# Altium footprint library ST封装.PcbLib: 1336 footprints (part 92 of 109)
Each footprint in its own frame and in the unit in brackets; x right, y up, seen from the top. Pads: shape width x height; smd on the part's side, far side on the other; paste and mask are expansions set on the pad; w line width, h text height; cw(c..) or ccw(c..) is an arc to the next point about the centre after c.
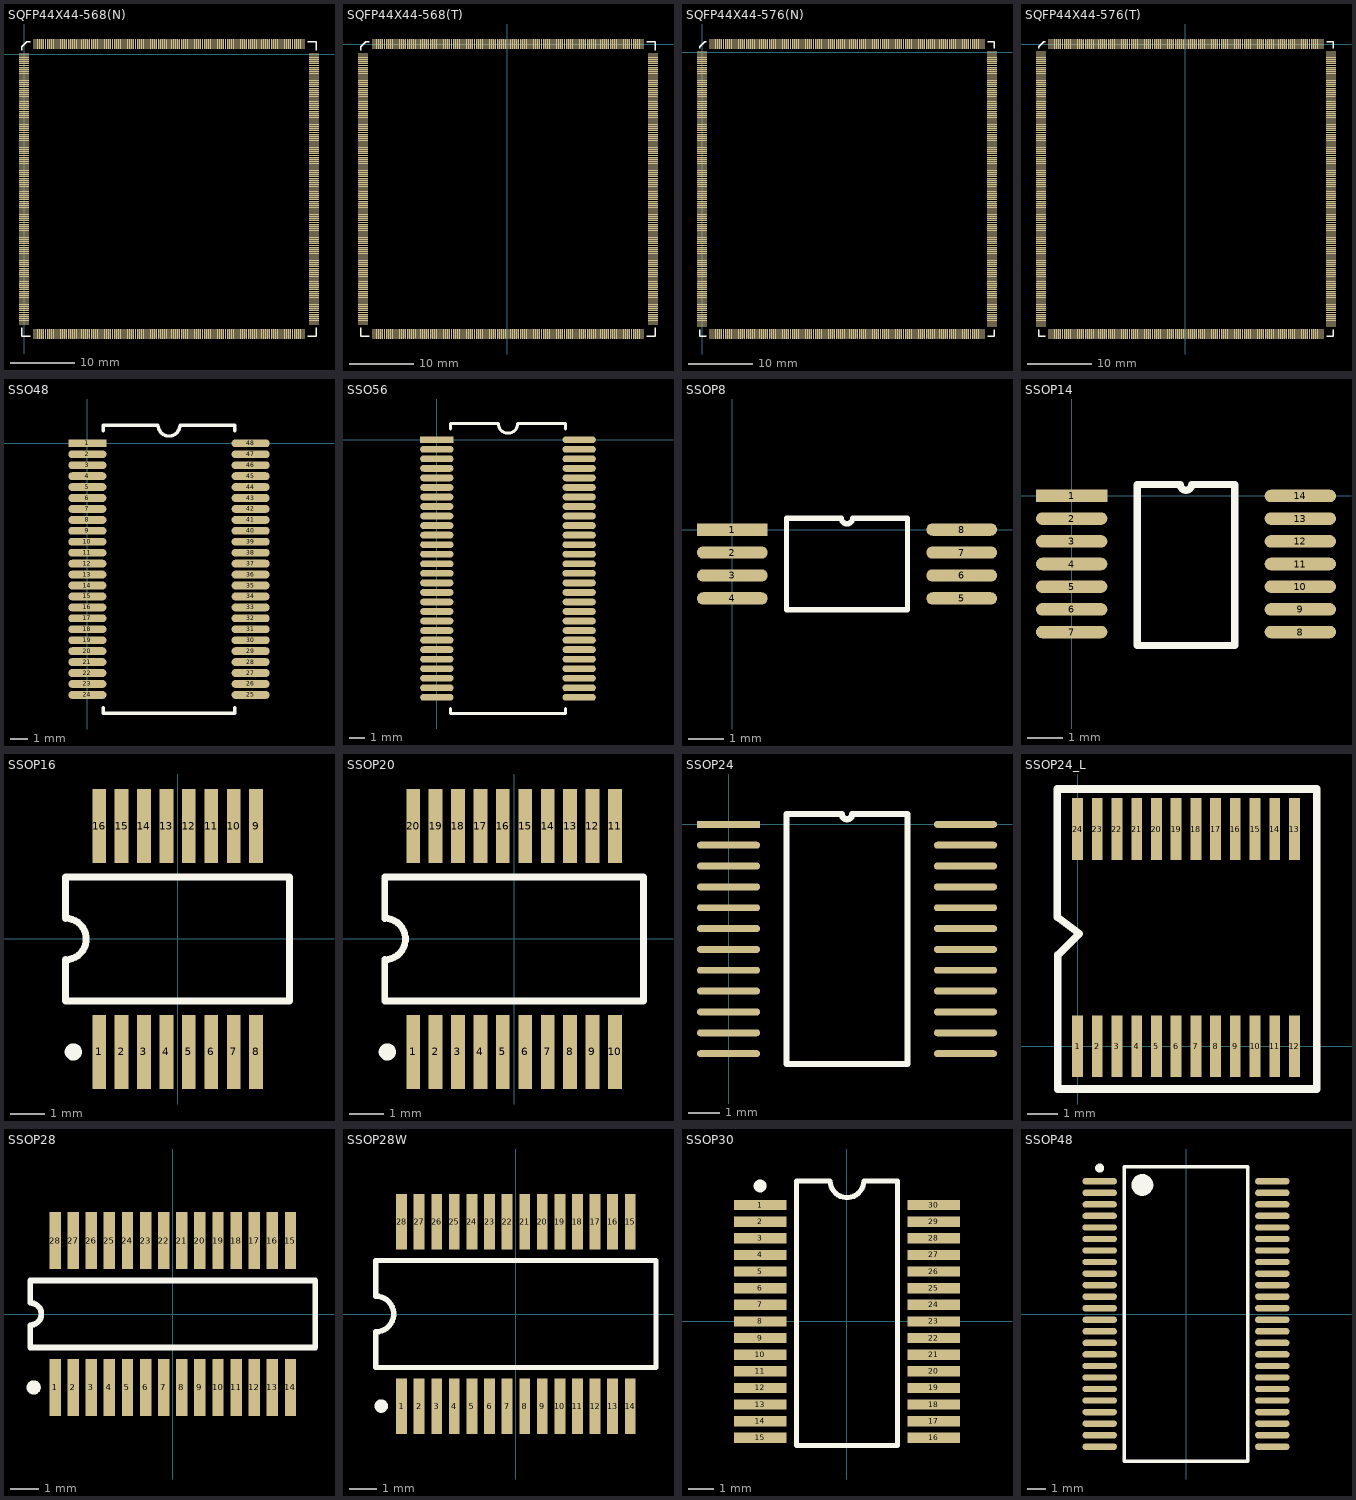
[diagram p91: the footprints below, top view; thin cyan lines are the x and y axes]

## SQFP44X44-568(N) [mm]
pads (568):
  rect 1.6x0.2 smd: 1(0,0)
  oval 1.6x0.2 smd: 2(0,-0.3) 3(0,-0.6) 4(0,-0.9) 5(0,-1.2) 6(0,-1.5) 7(0,-1.8) 8(0,-2.1) 9(0,-2.4) 10(0,-2.7) 11(0,-3) 12(0,-3.3) 13(0,-3.6) 14(0,-3.9) 15(0,-4.2) 16(0,-4.5) 17(0,-4.8) 18(0,-5.1) 19(0,-5.4) 20(0,-5.7) 21(0,-6) 22(0,-6.3) 23(0,-6.6) 24(0,-6.9) 25(0,-7.2) 26(0,-7.5) 27(0,-7.8) 28(0,-8.1) 29(0,-8.4) 30(0,-8.7) 31(0,-9) 32(0,-9.3) 33(0,-9.6) 34(0,-9.9) 35(0,-10.2) 36(0,-10.5) 37(0,-10.8) 38(0,-11.1) 39(0,-11.4) 40(0,-11.7) 41(0,-12) 42(0,-12.3) 43(0,-12.6) 44(0,-12.9) 45(0,-13.2) 46(0,-13.5) 47(0,-13.8) 48(0,-14.1) 49(0,-14.4) 50(0,-14.7) 51(0,-15) 52(0,-15.3) 53(0,-15.6) 54(0,-15.9) 55(0,-16.2) 56(0,-16.5) 57(0,-16.8) 58(0,-17.1) 59(0,-17.4) 60(0,-17.7) 61(0,-18) 62(0,-18.3) 63(0,-18.6) 64(0,-18.9) 65(0,-19.2) 66(0,-19.5) 67(0,-19.8) 68(0,-20.1) 69(0,-20.4) 70(0,-20.7) 71(0,-21) 72(0,-21.3) 73(0,-21.6) 74(0,-21.9) 75(0,-22.2) 76(0,-22.5) 77(0,-22.8) 78(0,-23.1) 79(0,-23.4) 80(0,-23.7) 81(0,-24) 82(0,-24.3) 83(0,-24.6) 84(0,-24.9) 85(0,-25.2) 86(0,-25.5) 87(0,-25.8) 88(0,-26.1) 89(0,-26.4) 90(0,-26.7) 91(0,-27) 92(0,-27.3) 93(0,-27.6) 94(0,-27.9) 95(0,-28.2) 96(0,-28.5) 97(0,-28.8) 98(0,-29.1) 99(0,-29.4) 100(0,-29.7) 101(0,-30) 102(0,-30.3) 103(0,-30.6) 104(0,-30.9) 105(0,-31.2) 106(0,-31.5) 107(0,-31.8) 108(0,-32.1) 109(0,-32.4) 110(0,-32.7) 111(0,-33) 112(0,-33.3) 113(0,-33.6) 114(0,-33.9) 115(0,-34.2) 116(0,-34.5) 117(0,-34.8) 118(0,-35.1) 119(0,-35.4) 120(0,-35.7) 121(0,-36) 122(0,-36.3) 123(0,-36.6) 124(0,-36.9) 125(0,-37.2) 126(0,-37.5) 127(0,-37.8) 128(0,-38.1) 129(0,-38.4) 130(0,-38.7) 131(0,-39) 132(0,-39.3) 133(0,-39.6) 134(0,-39.9) 135(0,-40.2) 136(0,-40.5) 137(0,-40.8) 138(0,-41.1) 139(0,-41.4) 140(0,-41.7) 141(0,-42) 142(0,-42.3) 285(45.4,-42.3) 286(45.4,-42) 287(45.4,-41.7) 288(45.4,-41.4) 289(45.4,-41.1) 290(45.4,-40.8) 291(45.4,-40.5) 292(45.4,-40.2) 293(45.4,-39.9) 294(45.4,-39.6) 295(45.4,-39.3) 296(45.4,-39) 297(45.4,-38.7) 298(45.4,-38.4) 299(45.4,-38.1) 300(45.4,-37.8) 301(45.4,-37.5) 302(45.4,-37.2) 303(45.4,-36.9) 304(45.4,-36.6) 305(45.4,-36.3) 306(45.4,-36) 307(45.4,-35.7) 308(45.4,-35.4) 309(45.4,-35.1) 310(45.4,-34.8) 311(45.4,-34.5) 312(45.4,-34.2) 313(45.4,-33.9) 314(45.4,-33.6) 315(45.4,-33.3) 316(45.4,-33) 317(45.4,-32.7) 318(45.4,-32.4) 319(45.4,-32.1) 320(45.4,-31.8) 321(45.4,-31.5) 322(45.4,-31.2) 323(45.4,-30.9) 324(45.4,-30.6) 325(45.4,-30.3) 326(45.4,-30) 327(45.4,-29.7) 328(45.4,-29.4) 329(45.4,-29.1) 330(45.4,-28.8) 331(45.4,-28.5) 332(45.4,-28.2) 333(45.4,-27.9) 334(45.4,-27.6) 335(45.4,-27.3) 336(45.4,-27) 337(45.4,-26.7) 338(45.4,-26.4) 339(45.4,-26.1) 340(45.4,-25.8) 341(45.4,-25.5) 342(45.4,-25.2) 343(45.4,-24.9) 344(45.4,-24.6) 345(45.4,-24.3) 346(45.4,-24) 347(45.4,-23.7) 348(45.4,-23.4) 349(45.4,-23.1) 350(45.4,-22.8) 351(45.4,-22.5) 352(45.4,-22.2) 353(45.4,-21.9) 354(45.4,-21.6) 355(45.4,-21.3) 356(45.4,-21) 357(45.4,-20.7) 358(45.4,-20.4) 359(45.4,-20.1) 360(45.4,-19.8) 361(45.4,-19.5) 362(45.4,-19.2) 363(45.4,-18.9) 364(45.4,-18.6) 365(45.4,-18.3) 366(45.4,-18) 367(45.4,-17.7) 368(45.4,-17.4) 369(45.4,-17.1) 370(45.4,-16.8) 371(45.4,-16.5) 372(45.4,-16.2) 373(45.4,-15.9) 374(45.4,-15.6) 375(45.4,-15.3) 376(45.4,-15) 377(45.4,-14.7) 378(45.4,-14.4) 379(45.4,-14.1) 380(45.4,-13.8) 381(45.4,-13.5) 382(45.4,-13.2) 383(45.4,-12.9) 384(45.4,-12.6) 385(45.4,-12.3) 386(45.4,-12) 387(45.4,-11.7) 388(45.4,-11.4) 389(45.4,-11.1) 390(45.4,-10.8) 391(45.4,-10.5) 392(45.4,-10.2) 393(45.4,-9.9) 394(45.4,-9.6) 395(45.4,-9.3) 396(45.4,-9) 397(45.4,-8.7) 398(45.4,-8.4) 399(45.4,-8.1) 400(45.4,-7.8) 401(45.4,-7.5) 402(45.4,-7.2) 403(45.4,-6.9) 404(45.4,-6.6) 405(45.4,-6.3) 406(45.4,-6) 407(45.4,-5.7) 408(45.4,-5.4) 409(45.4,-5.1) 410(45.4,-4.8) 411(45.4,-4.5) 412(45.4,-4.2) 413(45.4,-3.9) 414(45.4,-3.6) 415(45.4,-3.3) 416(45.4,-3) 417(45.4,-2.7) 418(45.4,-2.4) 419(45.4,-2.1) 420(45.4,-1.8) 421(45.4,-1.5) 422(45.4,-1.2) 423(45.4,-0.9) 424(45.4,-0.6) 425(45.4,-0.3) 426(45.4,0)
  oval 0.2x1.6 smd: 143(1.55,-43.85) 144(1.85,-43.85) 145(2.15,-43.85) 146(2.45,-43.85) 147(2.75,-43.85) 148(3.05,-43.85) 149(3.35,-43.85) 150(3.65,-43.85) 151(3.95,-43.85) 152(4.25,-43.85) 153(4.55,-43.85) 154(4.85,-43.85) 155(5.15,-43.85) 156(5.45,-43.85) 157(5.75,-43.85) 158(6.05,-43.85) 159(6.35,-43.85) 160(6.65,-43.85) 161(6.95,-43.85) 162(7.25,-43.85) 163(7.55,-43.85) 164(7.85,-43.85) 165(8.15,-43.85) 166(8.45,-43.85) 167(8.75,-43.85) 168(9.05,-43.85) 169(9.35,-43.85) 170(9.65,-43.85) 171(9.95,-43.85) 172(10.25,-43.85) 173(10.55,-43.85) 174(10.85,-43.85) 175(11.15,-43.85) 176(11.45,-43.85) 177(11.75,-43.85) 178(12.05,-43.85) 179(12.35,-43.85) 180(12.65,-43.85) 181(12.95,-43.85) 182(13.25,-43.85) 183(13.55,-43.85) 184(13.85,-43.85) 185(14.15,-43.85) 186(14.45,-43.85) 187(14.75,-43.85) 188(15.05,-43.85) 189(15.35,-43.85) 190(15.65,-43.85) 191(15.95,-43.85) 192(16.25,-43.85) 193(16.55,-43.85) 194(16.85,-43.85) 195(17.15,-43.85) 196(17.45,-43.85) 197(17.75,-43.85) 198(18.05,-43.85) 199(18.35,-43.85) 200(18.65,-43.85) 201(18.95,-43.85) 202(19.25,-43.85) 203(19.55,-43.85) 204(19.85,-43.85) 205(20.15,-43.85) 206(20.45,-43.85) 207(20.75,-43.85) 208(21.05,-43.85) 209(21.35,-43.85) 210(21.65,-43.85) 211(21.95,-43.85) 212(22.25,-43.85) 213(22.55,-43.85) 214(22.85,-43.85) 215(23.15,-43.85) 216(23.45,-43.85) 217(23.75,-43.85) 218(24.05,-43.85) 219(24.35,-43.85) 220(24.65,-43.85) 221(24.95,-43.85) 222(25.25,-43.85) 223(25.55,-43.85) 224(25.85,-43.85) 225(26.15,-43.85) 226(26.45,-43.85) 227(26.75,-43.85) 228(27.05,-43.85) 229(27.35,-43.85) 230(27.65,-43.85) 231(27.95,-43.85) 232(28.25,-43.85) 233(28.55,-43.85) 234(28.85,-43.85) 235(29.15,-43.85) 236(29.45,-43.85) 237(29.75,-43.85) 238(30.05,-43.85) 239(30.35,-43.85) 240(30.65,-43.85) 241(30.95,-43.85) 242(31.25,-43.85) 243(31.55,-43.85) 244(31.85,-43.85) 245(32.15,-43.85) 246(32.45,-43.85) 247(32.75,-43.85) 248(33.05,-43.85) 249(33.35,-43.85) 250(33.65,-43.85) 251(33.95,-43.85) 252(34.25,-43.85) 253(34.55,-43.85) 254(34.85,-43.85) 255(35.15,-43.85) 256(35.45,-43.85) 257(35.75,-43.85) 258(36.05,-43.85) 259(36.35,-43.85) 260(36.65,-43.85) 261(36.95,-43.85) 262(37.25,-43.85) 263(37.55,-43.85) 264(37.85,-43.85) 265(38.15,-43.85) 266(38.45,-43.85) 267(38.75,-43.85) 268(39.05,-43.85) 269(39.35,-43.85) 270(39.65,-43.85) 271(39.95,-43.85) 272(40.25,-43.85) 273(40.55,-43.85) 274(40.85,-43.85) 275(41.15,-43.85) 276(41.45,-43.85) 277(41.75,-43.85) 278(42.05,-43.85) 279(42.35,-43.85) 280(42.65,-43.85) 281(42.95,-43.85) 282(43.25,-43.85) 283(43.55,-43.85) 284(43.85,-43.85) 427(43.85,1.55) 428(43.55,1.55) 429(43.25,1.55) 430(42.95,1.55) 431(42.65,1.55) 432(42.35,1.55) 433(42.05,1.55) 434(41.75,1.55) 435(41.45,1.55) 436(41.15,1.55) 437(40.85,1.55) 438(40.55,1.55) 439(40.25,1.55) 440(39.95,1.55) 441(39.65,1.55) 442(39.35,1.55) 443(39.05,1.55) 444(38.75,1.55) 445(38.45,1.55) 446(38.15,1.55) 447(37.85,1.55) 448(37.55,1.55) 449(37.25,1.55) 450(36.95,1.55) 451(36.65,1.55) 452(36.35,1.55) 453(36.05,1.55) 454(35.75,1.55) 455(35.45,1.55) 456(35.15,1.55) 457(34.85,1.55) 458(34.55,1.55) 459(34.25,1.55) 460(33.95,1.55) 461(33.65,1.55) 462(33.35,1.55) 463(33.05,1.55) 464(32.75,1.55) 465(32.45,1.55) 466(32.15,1.55) 467(31.85,1.55) 468(31.55,1.55) 469(31.25,1.55) 470(30.95,1.55) 471(30.65,1.55) 472(30.35,1.55) 473(30.05,1.55) 474(29.75,1.55) 475(29.45,1.55) 476(29.15,1.55) 477(28.85,1.55) 478(28.55,1.55) 479(28.25,1.55) 480(27.95,1.55) 481(27.65,1.55) 482(27.35,1.55) 483(27.05,1.55) 484(26.75,1.55) 485(26.45,1.55) 486(26.15,1.55) 487(25.85,1.55) 488(25.55,1.55) 489(25.25,1.55) 490(24.95,1.55) 491(24.65,1.55) 492(24.35,1.55) 493(24.05,1.55) 494(23.75,1.55) 495(23.45,1.55) 496(23.15,1.55) 497(22.85,1.55) 498(22.55,1.55) 499(22.25,1.55) 500(21.95,1.55) 501(21.65,1.55) 502(21.35,1.55) 503(21.05,1.55) 504(20.75,1.55) 505(20.45,1.55) 506(20.15,1.55) 507(19.85,1.55) 508(19.55,1.55) 509(19.25,1.55) 510(18.95,1.55) 511(18.65,1.55) 512(18.35,1.55) 513(18.05,1.55) 514(17.75,1.55) 515(17.45,1.55) 516(17.15,1.55) 517(16.85,1.55) 518(16.55,1.55) 519(16.25,1.55) 520(15.95,1.55) 521(15.65,1.55) 522(15.35,1.55) 523(15.05,1.55) 524(14.75,1.55) 525(14.45,1.55) 526(14.15,1.55) 527(13.85,1.55) 528(13.55,1.55) 529(13.25,1.55) 530(12.95,1.55) 531(12.65,1.55) 532(12.35,1.55) 533(12.05,1.55) 534(11.75,1.55) 535(11.45,1.55) 536(11.15,1.55) 537(10.85,1.55) 538(10.55,1.55) 539(10.25,1.55) 540(9.95,1.55) 541(9.65,1.55) 542(9.35,1.55) 543(9.05,1.55) 544(8.75,1.55) 545(8.45,1.55) 546(8.15,1.55) 547(7.85,1.55) 548(7.55,1.55) 549(7.25,1.55) 550(6.95,1.55) 551(6.65,1.55) 552(6.35,1.55) 553(6.05,1.55) 554(5.75,1.55) 555(5.45,1.55) 556(5.15,1.55) 557(4.85,1.55) 558(4.55,1.55) 559(4.25,1.55) 560(3.95,1.55) 561(3.65,1.55) 562(3.35,1.55) 563(3.05,1.55) 564(2.75,1.55) 565(2.45,1.55) 566(2.15,1.55) 567(1.85,1.55) 568(1.55,1.55)
Top Overlay:
  lines w0.2: -0.4,-42.9 -0.4,-44.25 0.95,-44.25 ; -0.4,0.6 -0.4,1.15 0.4,1.95 0.95,1.95 ; 44.45,-44.25 45.8,-44.25 45.8,-42.9 ; 44.45,1.95 45.8,1.95 45.8,0.6

## SQFP44X44-568(T) [mm]
pads (568):
  rect 0.2x1.6 smd: 1(0,0)
  oval 0.2x1.6 smd: 2(-0.3,0) 3(-0.6,0) 4(-0.9,0) 5(-1.2,0) 6(-1.5,0) 7(-1.8,0) 8(-2.1,0) 9(-2.4,0) 10(-2.7,0) 11(-3,0) 12(-3.3,0) 13(-3.6,0) 14(-3.9,0) 15(-4.2,0) 16(-4.5,0) 17(-4.8,0) 18(-5.1,0) 19(-5.4,0) 20(-5.7,0) 21(-6,0) 22(-6.3,0) 23(-6.6,0) 24(-6.9,0) 25(-7.2,0) 26(-7.5,0) 27(-7.8,0) 28(-8.1,0) 29(-8.4,0) 30(-8.7,0) 31(-9,0) 32(-9.3,0) 33(-9.6,0) 34(-9.9,0) 35(-10.2,0) 36(-10.5,0) 37(-10.8,0) 38(-11.1,0) 39(-11.4,0) 40(-11.7,0) 41(-12,0) 42(-12.3,0) 43(-12.6,0) 44(-12.9,0) 45(-13.2,0) 46(-13.5,0) 47(-13.8,0) 48(-14.1,0) 49(-14.4,0) 50(-14.7,0) 51(-15,0) 52(-15.3,0) 53(-15.6,0) 54(-15.9,0) 55(-16.2,0) 56(-16.5,0) 57(-16.8,0) 58(-17.1,0) 59(-17.4,0) 60(-17.7,0) 61(-18,0) 62(-18.3,0) 63(-18.6,0) 64(-18.9,0) 65(-19.2,0) 66(-19.5,0) 67(-19.8,0) 68(-20.1,0) 69(-20.4,0) 70(-20.7,0) 71(-21,0) 214(-21,-45.4) 215(-20.7,-45.4) 216(-20.4,-45.4) 217(-20.1,-45.4) 218(-19.8,-45.4) 219(-19.5,-45.4) 220(-19.2,-45.4) 221(-18.9,-45.4) 222(-18.6,-45.4) 223(-18.3,-45.4) 224(-18,-45.4) 225(-17.7,-45.4) 226(-17.4,-45.4) 227(-17.1,-45.4) 228(-16.8,-45.4) 229(-16.5,-45.4) 230(-16.2,-45.4) 231(-15.9,-45.4) 232(-15.6,-45.4) 233(-15.3,-45.4) 234(-15,-45.4) 235(-14.7,-45.4) 236(-14.4,-45.4) 237(-14.1,-45.4) 238(-13.8,-45.4) 239(-13.5,-45.4) 240(-13.2,-45.4) 241(-12.9,-45.4) 242(-12.6,-45.4) 243(-12.3,-45.4) 244(-12,-45.4) 245(-11.7,-45.4) 246(-11.4,-45.4) 247(-11.1,-45.4) 248(-10.8,-45.4) 249(-10.5,-45.4) 250(-10.2,-45.4) 251(-9.9,-45.4) 252(-9.6,-45.4) 253(-9.3,-45.4) 254(-9,-45.4) 255(-8.7,-45.4) 256(-8.4,-45.4) 257(-8.1,-45.4) 258(-7.8,-45.4) 259(-7.5,-45.4) 260(-7.2,-45.4) 261(-6.9,-45.4) 262(-6.6,-45.4) 263(-6.3,-45.4) 264(-6,-45.4) 265(-5.7,-45.4) 266(-5.4,-45.4) 267(-5.1,-45.4) 268(-4.8,-45.4) 269(-4.5,-45.4) 270(-4.2,-45.4) 271(-3.9,-45.4) 272(-3.6,-45.4) 273(-3.3,-45.4) 274(-3,-45.4) 275(-2.7,-45.4) 276(-2.4,-45.4) 277(-2.1,-45.4) 278(-1.8,-45.4) 279(-1.5,-45.4) 280(-1.2,-45.4) 281(-0.9,-45.4) 282(-0.6,-45.4) 283(-0.3,-45.4) 284(0,-45.4) 285(0.3,-45.4) 286(0.6,-45.4) 287(0.9,-45.4) 288(1.2,-45.4) 289(1.5,-45.4) 290(1.8,-45.4) 291(2.1,-45.4) 292(2.4,-45.4) 293(2.7,-45.4) 294(3,-45.4) 295(3.3,-45.4) 296(3.6,-45.4) 297(3.9,-45.4) 298(4.2,-45.4) 299(4.5,-45.4) 300(4.8,-45.4) 301(5.1,-45.4) 302(5.4,-45.4) 303(5.7,-45.4) 304(6,-45.4) 305(6.3,-45.4) 306(6.6,-45.4) 307(6.9,-45.4) 308(7.2,-45.4) 309(7.5,-45.4) 310(7.8,-45.4) 311(8.1,-45.4) 312(8.4,-45.4) 313(8.7,-45.4) 314(9,-45.4) 315(9.3,-45.4) 316(9.6,-45.4) 317(9.9,-45.4) 318(10.2,-45.4) 319(10.5,-45.4) 320(10.8,-45.4) 321(11.1,-45.4) 322(11.4,-45.4) 323(11.7,-45.4) 324(12,-45.4) 325(12.3,-45.4) 326(12.6,-45.4) 327(12.9,-45.4) 328(13.2,-45.4) 329(13.5,-45.4) 330(13.8,-45.4) 331(14.1,-45.4) 332(14.4,-45.4) 333(14.7,-45.4) 334(15,-45.4) 335(15.3,-45.4) 336(15.6,-45.4) 337(15.9,-45.4) 338(16.2,-45.4) 339(16.5,-45.4) 340(16.8,-45.4) 341(17.1,-45.4) 342(17.4,-45.4) 343(17.7,-45.4) 344(18,-45.4) 345(18.3,-45.4) 346(18.6,-45.4) 347(18.9,-45.4) 348(19.2,-45.4) 349(19.5,-45.4) 350(19.8,-45.4) 351(20.1,-45.4) 352(20.4,-45.4) 353(20.7,-45.4) 354(21,-45.4) 355(21.3,-45.4) 498(21.3,0) 499(21,0) 500(20.7,0) 501(20.4,0) 502(20.1,0) 503(19.8,0) 504(19.5,0) 505(19.2,0) 506(18.9,0) 507(18.6,0) 508(18.3,0) 509(18,0) 510(17.7,0) 511(17.4,0) 512(17.1,0) 513(16.8,0) 514(16.5,0) 515(16.2,0) 516(15.9,0) 517(15.6,0) 518(15.3,0) 519(15,0) 520(14.7,0) 521(14.4,0) 522(14.1,0) 523(13.8,0) 524(13.5,0) 525(13.2,0) 526(12.9,0) 527(12.6,0) 528(12.3,0) 529(12,0) 530(11.7,0) 531(11.4,0) 532(11.1,0) 533(10.8,0) 534(10.5,0) 535(10.2,0) 536(9.9,0) 537(9.6,0) 538(9.3,0) 539(9,0) 540(8.7,0) 541(8.4,0) 542(8.1,0) 543(7.8,0) 544(7.5,0) 545(7.2,0) 546(6.9,0) 547(6.6,0) 548(6.3,0) 549(6,0) 550(5.7,0) 551(5.4,0) 552(5.1,0) 553(4.8,0) 554(4.5,0) 555(4.2,0) 556(3.9,0) 557(3.6,0) 558(3.3,0) 559(3,0) 560(2.7,0) 561(2.4,0) 562(2.1,0) 563(1.8,0) 564(1.5,0) 565(1.2,0) 566(0.9,0) 567(0.6,0) 568(0.3,0)
  oval 1.6x0.2 smd: 72(-22.55,-1.55) 73(-22.55,-1.85) 74(-22.55,-2.15) 75(-22.55,-2.45) 76(-22.55,-2.75) 77(-22.55,-3.05) 78(-22.55,-3.35) 79(-22.55,-3.65) 80(-22.55,-3.95) 81(-22.55,-4.25) 82(-22.55,-4.55) 83(-22.55,-4.85) 84(-22.55,-5.15) 85(-22.55,-5.45) 86(-22.55,-5.75) 87(-22.55,-6.05) 88(-22.55,-6.35) 89(-22.55,-6.65) 90(-22.55,-6.95) 91(-22.55,-7.25) 92(-22.55,-7.55) 93(-22.55,-7.85) 94(-22.55,-8.15) 95(-22.55,-8.45) 96(-22.55,-8.75) 97(-22.55,-9.05) 98(-22.55,-9.35) 99(-22.55,-9.65) 100(-22.55,-9.95) 101(-22.55,-10.25) 102(-22.55,-10.55) 103(-22.55,-10.85) 104(-22.55,-11.15) 105(-22.55,-11.45) 106(-22.55,-11.75) 107(-22.55,-12.05) 108(-22.55,-12.35) 109(-22.55,-12.65) 110(-22.55,-12.95) 111(-22.55,-13.25) 112(-22.55,-13.55) 113(-22.55,-13.85) 114(-22.55,-14.15) 115(-22.55,-14.45) 116(-22.55,-14.75) 117(-22.55,-15.05) 118(-22.55,-15.35) 119(-22.55,-15.65) 120(-22.55,-15.95) 121(-22.55,-16.25) 122(-22.55,-16.55) 123(-22.55,-16.85) 124(-22.55,-17.15) 125(-22.55,-17.45) 126(-22.55,-17.75) 127(-22.55,-18.05) 128(-22.55,-18.35) 129(-22.55,-18.65) 130(-22.55,-18.95) 131(-22.55,-19.25) 132(-22.55,-19.55) 133(-22.55,-19.85) 134(-22.55,-20.15) 135(-22.55,-20.45) 136(-22.55,-20.75) 137(-22.55,-21.05) 138(-22.55,-21.35) 139(-22.55,-21.65) 140(-22.55,-21.95) 141(-22.55,-22.25) 142(-22.55,-22.55) 143(-22.55,-22.85) 144(-22.55,-23.15) 145(-22.55,-23.45) 146(-22.55,-23.75) 147(-22.55,-24.05) 148(-22.55,-24.35) 149(-22.55,-24.65) 150(-22.55,-24.95) 151(-22.55,-25.25) 152(-22.55,-25.55) 153(-22.55,-25.85) 154(-22.55,-26.15) 155(-22.55,-26.45) 156(-22.55,-26.75) 157(-22.55,-27.05) 158(-22.55,-27.35) 159(-22.55,-27.65) 160(-22.55,-27.95) 161(-22.55,-28.25) 162(-22.55,-28.55) 163(-22.55,-28.85) 164(-22.55,-29.15) 165(-22.55,-29.45) 166(-22.55,-29.75) 167(-22.55,-30.05) 168(-22.55,-30.35) 169(-22.55,-30.65) 170(-22.55,-30.95) 171(-22.55,-31.25) 172(-22.55,-31.55) 173(-22.55,-31.85) 174(-22.55,-32.15) 175(-22.55,-32.45) 176(-22.55,-32.75) 177(-22.55,-33.05) 178(-22.55,-33.35) 179(-22.55,-33.65) 180(-22.55,-33.95) 181(-22.55,-34.25) 182(-22.55,-34.55) 183(-22.55,-34.85) 184(-22.55,-35.15) 185(-22.55,-35.45) 186(-22.55,-35.75) 187(-22.55,-36.05) 188(-22.55,-36.35) 189(-22.55,-36.65) 190(-22.55,-36.95) 191(-22.55,-37.25) 192(-22.55,-37.55) 193(-22.55,-37.85) 194(-22.55,-38.15) 195(-22.55,-38.45) 196(-22.55,-38.75) 197(-22.55,-39.05) 198(-22.55,-39.35) 199(-22.55,-39.65) 200(-22.55,-39.95) 201(-22.55,-40.25) 202(-22.55,-40.55) 203(-22.55,-40.85) 204(-22.55,-41.15) 205(-22.55,-41.45) 206(-22.55,-41.75) 207(-22.55,-42.05) 208(-22.55,-42.35) 209(-22.55,-42.65) 210(-22.55,-42.95) 211(-22.55,-43.25) 212(-22.55,-43.55) 213(-22.55,-43.85) 356(22.85,-43.85) 357(22.85,-43.55) 358(22.85,-43.25) 359(22.85,-42.95) 360(22.85,-42.65) 361(22.85,-42.35) 362(22.85,-42.05) 363(22.85,-41.75) 364(22.85,-41.45) 365(22.85,-41.15) 366(22.85,-40.85) 367(22.85,-40.55) 368(22.85,-40.25) 369(22.85,-39.95) 370(22.85,-39.65) 371(22.85,-39.35) 372(22.85,-39.05) 373(22.85,-38.75) 374(22.85,-38.45) 375(22.85,-38.15) 376(22.85,-37.85) 377(22.85,-37.55) 378(22.85,-37.25) 379(22.85,-36.95) 380(22.85,-36.65) 381(22.85,-36.35) 382(22.85,-36.05) 383(22.85,-35.75) 384(22.85,-35.45) 385(22.85,-35.15) 386(22.85,-34.85) 387(22.85,-34.55) 388(22.85,-34.25) 389(22.85,-33.95) 390(22.85,-33.65) 391(22.85,-33.35) 392(22.85,-33.05) 393(22.85,-32.75) 394(22.85,-32.45) 395(22.85,-32.15) 396(22.85,-31.85) 397(22.85,-31.55) 398(22.85,-31.25) 399(22.85,-30.95) 400(22.85,-30.65) 401(22.85,-30.35) 402(22.85,-30.05) 403(22.85,-29.75) 404(22.85,-29.45) 405(22.85,-29.15) 406(22.85,-28.85) 407(22.85,-28.55) 408(22.85,-28.25) 409(22.85,-27.95) 410(22.85,-27.65) 411(22.85,-27.35) 412(22.85,-27.05) 413(22.85,-26.75) 414(22.85,-26.45) 415(22.85,-26.15) 416(22.85,-25.85) 417(22.85,-25.55) 418(22.85,-25.25) 419(22.85,-24.95) 420(22.85,-24.65) 421(22.85,-24.35) 422(22.85,-24.05) 423(22.85,-23.75) 424(22.85,-23.45) 425(22.85,-23.15) 426(22.85,-22.85) 427(22.85,-22.55) 428(22.85,-22.25) 429(22.85,-21.95) 430(22.85,-21.65) 431(22.85,-21.35) 432(22.85,-21.05) 433(22.85,-20.75) 434(22.85,-20.45) 435(22.85,-20.15) 436(22.85,-19.85) 437(22.85,-19.55) 438(22.85,-19.25) 439(22.85,-18.95) 440(22.85,-18.65) 441(22.85,-18.35) 442(22.85,-18.05) 443(22.85,-17.75) 444(22.85,-17.45) 445(22.85,-17.15) 446(22.85,-16.85) 447(22.85,-16.55) 448(22.85,-16.25) 449(22.85,-15.95) 450(22.85,-15.65) 451(22.85,-15.35) 452(22.85,-15.05) 453(22.85,-14.75) 454(22.85,-14.45) 455(22.85,-14.15) 456(22.85,-13.85) 457(22.85,-13.55) 458(22.85,-13.25) 459(22.85,-12.95) 460(22.85,-12.65) 461(22.85,-12.35) 462(22.85,-12.05) 463(22.85,-11.75) 464(22.85,-11.45) 465(22.85,-11.15) 466(22.85,-10.85) 467(22.85,-10.55) 468(22.85,-10.25) 469(22.85,-9.95) 470(22.85,-9.65) 471(22.85,-9.35) 472(22.85,-9.05) 473(22.85,-8.75) 474(22.85,-8.45) 475(22.85,-8.15) 476(22.85,-7.85) 477(22.85,-7.55) 478(22.85,-7.25) 479(22.85,-6.95) 480(22.85,-6.65) 481(22.85,-6.35) 482(22.85,-6.05) 483(22.85,-5.75) 484(22.85,-5.45) 485(22.85,-5.15) 486(22.85,-4.85) 487(22.85,-4.55) 488(22.85,-4.25) 489(22.85,-3.95) 490(22.85,-3.65) 491(22.85,-3.35) 492(22.85,-3.05) 493(22.85,-2.75) 494(22.85,-2.45) 495(22.85,-2.15) 496(22.85,-1.85) 497(22.85,-1.55)
Top Overlay:
  lines w0.2: -22.95,-44.45 -22.95,-45.8 -21.6,-45.8 ; -22.95,-0.95 -22.95,-0.4 -22.15,0.4 -21.6,0.4 ; 21.9,-45.8 23.25,-45.8 23.25,-44.45 ; 21.9,0.4 23.25,0.4 23.25,-0.95

## SQFP44X44-576(N) [mm]
pads (576):
  rect 1.6x0.2 smd: 1(0,0)
  oval 1.6x0.2 smd: 2(0,-0.3) 3(0,-0.6) 4(0,-0.9) 5(0,-1.2) 6(0,-1.5) 7(0,-1.8) 8(0,-2.1) 9(0,-2.4) 10(0,-2.7) 11(0,-3) 12(0,-3.3) 13(0,-3.6) 14(0,-3.9) 15(0,-4.2) 16(0,-4.5) 17(0,-4.8) 18(0,-5.1) 19(0,-5.4) 20(0,-5.7) 21(0,-6) 22(0,-6.3) 23(0,-6.6) 24(0,-6.9) 25(0,-7.2) 26(0,-7.5) 27(0,-7.8) 28(0,-8.1) 29(0,-8.4) 30(0,-8.7) 31(0,-9) 32(0,-9.3) 33(0,-9.6) 34(0,-9.9) 35(0,-10.2) 36(0,-10.5) 37(0,-10.8) 38(0,-11.1) 39(0,-11.4) 40(0,-11.7) 41(0,-12) 42(0,-12.3) 43(0,-12.6) 44(0,-12.9) 45(0,-13.2) 46(0,-13.5) 47(0,-13.8) 48(0,-14.1) 49(0,-14.4) 50(0,-14.7) 51(0,-15) 52(0,-15.3) 53(0,-15.6) 54(0,-15.9) 55(0,-16.2) 56(0,-16.5) 57(0,-16.8) 58(0,-17.1) 59(0,-17.4) 60(0,-17.7) 61(0,-18) 62(0,-18.3) 63(0,-18.6) 64(0,-18.9) 65(0,-19.2) 66(0,-19.5) 67(0,-19.8) 68(0,-20.1) 69(0,-20.4) 70(0,-20.7) 71(0,-21) 72(0,-21.3) 73(0,-21.6) 74(0,-21.9) 75(0,-22.2) 76(0,-22.5) 77(0,-22.8) 78(0,-23.1) 79(0,-23.4) 80(0,-23.7) 81(0,-24) 82(0,-24.3) 83(0,-24.6) 84(0,-24.9) 85(0,-25.2) 86(0,-25.5) 87(0,-25.8) 88(0,-26.1) 89(0,-26.4) 90(0,-26.7) 91(0,-27) 92(0,-27.3) 93(0,-27.6) 94(0,-27.9) 95(0,-28.2) 96(0,-28.5) 97(0,-28.8) 98(0,-29.1) 99(0,-29.4) 100(0,-29.7) 101(0,-30) 102(0,-30.3) 103(0,-30.6) 104(0,-30.9) 105(0,-31.2) 106(0,-31.5) 107(0,-31.8) 108(0,-32.1) 109(0,-32.4) 110(0,-32.7) 111(0,-33) 112(0,-33.3) 113(0,-33.6) 114(0,-33.9) 115(0,-34.2) 116(0,-34.5) 117(0,-34.8) 118(0,-35.1) 119(0,-35.4) 120(0,-35.7) 121(0,-36) 122(0,-36.3) 123(0,-36.6) 124(0,-36.9) 125(0,-37.2) 126(0,-37.5) 127(0,-37.8) 128(0,-38.1) 129(0,-38.4) 130(0,-38.7) 131(0,-39) 132(0,-39.3) 133(0,-39.6) 134(0,-39.9) 135(0,-40.2) 136(0,-40.5) 137(0,-40.8) 138(0,-41.1) 139(0,-41.4) 140(0,-41.7) 141(0,-42) 142(0,-42.3) 143(0,-42.6) 144(0,-42.9) 289(45.4,-42.9) 290(45.4,-42.6) 291(45.4,-42.3) 292(45.4,-42) 293(45.4,-41.7) 294(45.4,-41.4) 295(45.4,-41.1) 296(45.4,-40.8) 297(45.4,-40.5) 298(45.4,-40.2) 299(45.4,-39.9) 300(45.4,-39.6) 301(45.4,-39.3) 302(45.4,-39) 303(45.4,-38.7) 304(45.4,-38.4) 305(45.4,-38.1) 306(45.4,-37.8) 307(45.4,-37.5) 308(45.4,-37.2) 309(45.4,-36.9) 310(45.4,-36.6) 311(45.4,-36.3) 312(45.4,-36) 313(45.4,-35.7) 314(45.4,-35.4) 315(45.4,-35.1) 316(45.4,-34.8) 317(45.4,-34.5) 318(45.4,-34.2) 319(45.4,-33.9) 320(45.4,-33.6) 321(45.4,-33.3) 322(45.4,-33) 323(45.4,-32.7) 324(45.4,-32.4) 325(45.4,-32.1) 326(45.4,-31.8) 327(45.4,-31.5) 328(45.4,-31.2) 329(45.4,-30.9) 330(45.4,-30.6) 331(45.4,-30.3) 332(45.4,-30) 333(45.4,-29.7) 334(45.4,-29.4) 335(45.4,-29.1) 336(45.4,-28.8) 337(45.4,-28.5) 338(45.4,-28.2) 339(45.4,-27.9) 340(45.4,-27.6) 341(45.4,-27.3) 342(45.4,-27) 343(45.4,-26.7) 344(45.4,-26.4) 345(45.4,-26.1) 346(45.4,-25.8) 347(45.4,-25.5) 348(45.4,-25.2) 349(45.4,-24.9) 350(45.4,-24.6) 351(45.4,-24.3) 352(45.4,-24) 353(45.4,-23.7) 354(45.4,-23.4) 355(45.4,-23.1) 356(45.4,-22.8) 357(45.4,-22.5) 358(45.4,-22.2) 359(45.4,-21.9) 360(45.4,-21.6) 361(45.4,-21.3) 362(45.4,-21) 363(45.4,-20.7) 364(45.4,-20.4) 365(45.4,-20.1) 366(45.4,-19.8) 367(45.4,-19.5) 368(45.4,-19.2) 369(45.4,-18.9) 370(45.4,-18.6) 371(45.4,-18.3) 372(45.4,-18) 373(45.4,-17.7) 374(45.4,-17.4) 375(45.4,-17.1) 376(45.4,-16.8) 377(45.4,-16.5) 378(45.4,-16.2) 379(45.4,-15.9) 380(45.4,-15.6) 381(45.4,-15.3) 382(45.4,-15) 383(45.4,-14.7) 384(45.4,-14.4) 385(45.4,-14.1) 386(45.4,-13.8) 387(45.4,-13.5) 388(45.4,-13.2) 389(45.4,-12.9) 390(45.4,-12.6) 391(45.4,-12.3) 392(45.4,-12) 393(45.4,-11.7) 394(45.4,-11.4) 395(45.4,-11.1) 396(45.4,-10.8) 397(45.4,-10.5) 398(45.4,-10.2) 399(45.4,-9.9) 400(45.4,-9.6) 401(45.4,-9.3) 402(45.4,-9) 403(45.4,-8.7) 404(45.4,-8.4) 405(45.4,-8.1) 406(45.4,-7.8) 407(45.4,-7.5) 408(45.4,-7.2) 409(45.4,-6.9) 410(45.4,-6.6) 411(45.4,-6.3) 412(45.4,-6) 413(45.4,-5.7) 414(45.4,-5.4) 415(45.4,-5.1) 416(45.4,-4.8) 417(45.4,-4.5) 418(45.4,-4.2) 419(45.4,-3.9) 420(45.4,-3.6) 421(45.4,-3.3) 422(45.4,-3) 423(45.4,-2.7) 424(45.4,-2.4) 425(45.4,-2.1) 426(45.4,-1.8) 427(45.4,-1.5) 428(45.4,-1.2) 429(45.4,-0.9) 430(45.4,-0.6) 431(45.4,-0.3) 432(45.4,0)